# Altium footprint library Miscellaneous SMD.PcbLib: 82 footprints (part 6 of 7) (continued)
## PCI Express x4 [mm] "64 contacts Board Eddge PCI Express x4 Connector"
pads (64):
  rect 0.7x3.2 smd far side paste-0.4: A1(0.65,4)
  rect 0.7x4 smd far side paste-0.4: A2(1.65,3.6) A3(2.65,3.6) A4(3.65,3.6) A5(4.65,3.6) A6(5.65,3.6) A7(6.65,3.6) A8(7.65,3.6) A9(8.65,3.6) A10(9.65,3.6) A11(10.65,3.6) A12(13.65,3.6) A13(14.65,3.6) A14(15.65,3.6) A15(16.65,3.6) A16(17.65,3.6) A17(18.65,3.6) A18(19.65,3.6) A19(20.65,3.6) A20(21.65,3.6) A21(22.65,3.6) A22(23.65,3.601) A23(24.65,3.601) A24(25.65,3.601) A25(26.65,3.601) A26(27.65,3.601) A27(28.65,3.601) A28(29.65,3.601) A29(30.65,3.602) A30(31.65,3.602) A31(32.65,3.602) A32(33.65,3.602)
  rect 0.7x4 smd paste-0.4: B1(0.65,3.6) B2(1.65,3.6) B3(2.65,3.6) B4(3.65,3.6) B5(4.65,3.6) B6(5.65,3.6) B7(6.65,3.6) B8(7.65,3.6) B9(8.65,3.6) B10(9.65,3.6) B11(10.65,3.6) B12(13.65,3.6) B13(14.65,3.6) B14(15.65,3.6) B15(16.65,3.6) B16(17.65,3.6) B18(19.65,3.6) B19(20.65,3.6) B20(21.65,3.6) B21(22.65,3.6) B22(23.65,3.601) B23(24.65,3.601) B24(25.65,3.601) B25(26.65,3.601) B26(27.65,3.601) B27(28.65,3.601) B28(29.65,3.601) B29(30.65,3.602) B30(31.65,3.602) B32(33.65,3.602)
  rect 0.7x3.2 smd paste-0.4: B17(18.65,4) B31(32.65,4.002)
Top Overlay:
  text "B1" at 0.889,6.096 h0.76
  text "B11" at 10.889,6.096 h0.76
  text "B12" at 13.989,6.096 h0.76
  text "B18" at 19.989,6.096 h0.76
  text "B32" at 33.989,6.098 h0.76
Bottom Overlay:
  text "A1" at 0.051,6.02 h0.76
  text "A11" at 10.051,6.02 h0.76
  text "A12" at 13.151,6.02 h0.76
  text "A18" at 19.151,6.02 h0.76
  text "A32" at 33.151,6.022 h0.76
Mechanical 8:
  drawing of 280 lines, arcs and shapes, not listed

## PCI Express x8 [mm] "98 contacts Board Eddge PCI Express x8 Connector"
pads (98):
  rect 0.7x3.2 smd far side paste-0.4: A1(0.65,4)
  rect 0.7x4 smd far side paste-0.4: A2(1.65,3.6) A3(2.65,3.6) A4(3.65,3.6) A5(4.65,3.6) A6(5.65,3.6) A7(6.65,3.6) A8(7.65,3.6) A9(8.65,3.6) A10(9.65,3.6) A11(10.65,3.6) A12(13.65,3.6) A13(14.65,3.6) A14(15.65,3.6) A15(16.65,3.6) A16(17.65,3.6) A17(18.65,3.6) A18(19.65,3.6) A19(20.65,3.6) A20(21.65,3.6) A21(22.65,3.6) A22(23.65,3.601) A23(24.65,3.601) A24(25.65,3.601) A25(26.65,3.601) A26(27.65,3.601) A27(28.65,3.601) A28(29.65,3.601) A29(30.65,3.602) A30(31.65,3.602) A31(32.65,3.602) A32(33.65,3.602) A33(34.65,3.602) A34(35.65,3.602) A35(36.65,3.602) A36(37.65,3.602) A37(38.65,3.602) A38(39.65,3.602) A39(40.65,3.602) A40(41.65,3.602) A41(42.65,3.602) A42(43.65,3.602) A43(44.65,3.602) A44(45.65,3.602) A45(46.65,3.602) A46(47.65,3.602) A47(48.65,3.602) A48(49.65,3.602) A49(50.65,3.602)
  rect 0.7x4 smd paste-0.4: B1(0.65,3.6) B2(1.65,3.6) B3(2.65,3.6) B4(3.65,3.6) B5(4.65,3.6) B6(5.65,3.6) B7(6.65,3.6) B8(7.65,3.6) B9(8.65,3.6) B10(9.65,3.6) B11(10.65,3.6) B12(13.65,3.6) B13(14.65,3.6) B14(15.65,3.6) B15(16.65,3.6) B16(17.65,3.6) B18(19.65,3.6) B19(20.65,3.6) B20(21.65,3.6) B21(22.65,3.6) B22(23.65,3.601) B23(24.65,3.601) B24(25.65,3.601) B25(26.65,3.601) B26(27.65,3.601) B27(28.65,3.601) B28(29.65,3.601) B29(30.65,3.602) B30(31.65,3.602) B32(33.65,3.602) B33(34.65,3.602) B34(35.65,3.602) B35(36.65,3.602) B36(37.65,3.602) B37(38.65,3.602) B38(39.65,3.602) B39(40.65,3.602) B40(41.65,3.602) B41(42.65,3.602) B42(43.65,3.602) B43(44.65,3.602) B44(45.65,3.602) B45(46.65,3.602) B46(47.65,3.602) B47(48.65,3.602) B49(50.65,3.602)
  rect 0.7x3.2 smd paste-0.4: B17(18.65,4) B31(32.65,4.002) B48(49.65,4.002)
Top Overlay:
  text "B1" at 0.889,6.096 h0.76
  text "B11" at 10.889,6.096 h0.76
  text "B12" at 13.989,6.096 h0.76
  text "B18" at 19.989,6.096 h0.76
  text "B32" at 33.989,6.098 h0.76
  text "B49" at 50.989,6.098 h0.76
Bottom Overlay:
  text "A1" at 0.051,6.02 h0.76
  text "A11" at 10.051,6.02 h0.76
  text "A12" at 13.151,6.02 h0.76
  text "A18" at 19.151,6.02 h0.76
  text "A32" at 33.151,6.022 h0.76
  text "A49" at 50.151,6.022 h0.76
Mechanical 8:
  drawing of 308 lines, arcs and shapes, not listed

## PCI Express x16 [mm] "164 contacts Board Eddge PCI Express x16 Connector"
pads (164):
  rect 0.7x3.2 smd far side paste-0.4: A1(0.65,4)
  rect 0.7x4 smd far side paste-0.4: A2(1.65,3.6) A3(2.65,3.6) A4(3.65,3.6) A5(4.65,3.6) A6(5.65,3.6) A7(6.65,3.6) A8(7.65,3.6) A9(8.65,3.6) A10(9.65,3.6) A11(10.65,3.6) A12(13.65,3.6) A13(14.65,3.6) A14(15.65,3.6) A15(16.65,3.6) A16(17.65,3.6) A17(18.65,3.6) A18(19.65,3.6) A19(20.65,3.6) A20(21.65,3.6) A21(22.65,3.6) A22(23.65,3.601) A23(24.65,3.601) A24(25.65,3.601) A25(26.65,3.601) A26(27.65,3.601) A27(28.65,3.601) A28(29.65,3.601) A29(30.65,3.602) A30(31.65,3.602) A31(32.65,3.602) A32(33.65,3.602) A33(34.65,3.602) A34(35.65,3.602) A35(36.65,3.602) A36(37.65,3.602) A37(38.65,3.602) A38(39.65,3.602) A39(40.65,3.602) A40(41.65,3.602) A41(42.65,3.602) A42(43.65,3.602) A43(44.65,3.602) A44(45.65,3.602) A45(46.65,3.602) A46(47.65,3.602) A47(48.65,3.602) A48(49.65,3.602) A49(50.65,3.602) A50(51.65,3.602) A51(52.65,3.602) A52(53.65,3.602) A53(54.65,3.602) A54(55.65,3.602) A55(56.65,3.602) A56(57.65,3.602) A57(58.65,3.602) A58(59.65,3.602) A59(60.65,3.602) A60(61.65,3.602) A61(62.65,3.602) A62(63.65,3.602) A63(64.65,3.602) A64(65.65,3.602) A65(66.65,3.602) A66(67.65,3.602) A67(68.65,3.602) A68(69.65,3.602) A69(70.65,3.602) A70(71.65,3.602) A71(72.65,3.602) A72(73.65,3.602) A73(74.65,3.602) A74(75.65,3.602) A75(76.65,3.602) A76(77.65,3.602) A77(78.65,3.602) A78(79.65,3.602) A79(80.65,3.602) A80(81.65,3.602) A81(82.65,3.602) A82(83.65,3.602)
  rect 0.7x4 smd paste-0.4: B1(0.65,3.6) B2(1.65,3.6) B3(2.65,3.6) B4(3.65,3.6) B5(4.65,3.6) B6(5.65,3.6) B7(6.65,3.6) B8(7.65,3.6) B9(8.65,3.6) B10(9.65,3.6) B11(10.65,3.6) B12(13.65,3.6) B13(14.65,3.6) B14(15.65,3.6) B15(16.65,3.6) B16(17.65,3.6) B18(19.65,3.6) B19(20.65,3.6) B20(21.65,3.6) B21(22.65,3.6) B22(23.65,3.601) B23(24.65,3.601) B24(25.65,3.601) B25(26.65,3.601) B26(27.65,3.601) B27(28.65,3.601) B28(29.65,3.601) B29(30.65,3.602) B30(31.65,3.602) B32(33.65,3.602) B33(34.65,3.602) B34(35.65,3.602) B35(36.65,3.602) B36(37.65,3.602) B37(38.65,3.602) B38(39.65,3.602) B39(40.65,3.602) B40(41.65,3.602) B41(42.65,3.602) B42(43.65,3.602) B43(44.65,3.602) B44(45.65,3.602) B45(46.65,3.602) B46(47.65,3.602) B47(48.65,3.602) B49(50.65,3.602) B50(51.65,3.602) B51(52.65,3.602) B52(53.65,3.602) B53(54.65,3.602) B54(55.65,3.602) B55(56.65,3.602) B56(57.65,3.602) B57(58.65,3.602) B58(59.65,3.602) B59(60.65,3.602) B60(61.65,3.602) B61(62.65,3.602) B62(63.65,3.602) B63(64.65,3.602) B64(65.65,3.602) B65(66.65,3.602) B66(67.65,3.602) B67(68.65,3.602) B68(69.65,3.602) B69(70.65,3.602) B70(71.65,3.602) B71(72.65,3.602) B72(73.65,3.602) B73(74.65,3.602) B74(75.65,3.602) B75(76.65,3.602) B76(77.65,3.602) B77(78.65,3.602) B78(79.65,3.602) B79(80.65,3.602) B80(81.65,3.602) B82(83.65,3.602)
  rect 0.7x3.2 smd paste-0.4: B17(18.65,4) B31(32.65,4.002) B48(49.65,4.002) B81(82.65,4.002)
Top Overlay:
  text "B1" at 0.889,6.096 h0.76
  text "B11" at 10.889,6.096 h0.76
  text "B12" at 13.989,6.096 h0.76
  text "B18" at 19.989,6.096 h0.76
  text "B32" at 33.989,6.098 h0.76
  text "B49" at 50.989,6.098 h0.76
  text "B82" at 83.989,6.098 h0.76
Bottom Overlay:
  text "A1" at 0.051,6.02 h0.76
  text "A11" at 10.051,6.02 h0.76
  text "A12" at 13.151,6.02 h0.76
  text "A18" at 19.151,6.02 h0.76
  text "A32" at 33.151,6.022 h0.76
  text "A49" at 50.151,6.022 h0.76
  text "A82" at 83.151,6.022 h0.76
Mechanical 8:
  drawing of 328 lines, arcs and shapes, not listed

## QSFP+_PCB_EDGE [mm] "38 contacts Board Eddge QSFP+ Connector"
pads (38):
  rect 0.6x2.5 smd far side paste-0.4: 1(15.2,1.8) 4(12.8,1.8) 7(10.4,1.8) 13(5.6,1.8) 16(3.2,1.8) 19(0.8,1.8)
  rect 0.6x1.6 smd far side paste-0.4: 2(14.4,2.25) 3(13.6,2.25) 5(12,2.25) 6(11.2,2.25) 8(9.6,2.25) 9(8.8,2.25) 11(7.2,2.25) 12(6.4,2.25) 14(4.8,2.25) 15(4,2.25) 17(2.4,2.25) 18(1.6,2.25)
  rect 0.6x2 smd far side paste-0.4: 10(8,2.05)
  rect 0.6x2.5 smd paste-0.4: 20(1.2,1.8) 23(3.6,1.8) 26(6,1.8) 32(10.8,1.8) 35(13.2,1.8) 38(15.6,1.8)
  rect 0.6x1.6 smd paste-0.4: 21(2,2.25) 22(2.8,2.25) 24(4.4,2.25) 25(5.2,2.25) 27(6.8,2.25) 28(7.6,2.25) 30(9.2,2.25) 31(10,2.25) 33(11.6,2.25) 34(12.4,2.25) 36(14,2.25) 37(14.8,2.25)
  rect 0.6x2 smd paste-0.4: 29(8.4,2.05)
Top Layer:
  region: 8.1,0.95 8.7,0.95 8.7,0.55 8.1,0.55
  region: 1.7,1.35 2.3,1.35 2.3,0.55 1.7,0.55
  region: 2.5,1.35 3.1,1.35 3.1,0.55 2.5,0.55
  region: 4.9,1.35 5.5,1.35 5.5,0.55 4.9,0.55
  region: 4.1,1.35 4.7,1.35 4.7,0.55 4.1,0.55
  region: 7.3,1.35 7.9,1.35 7.9,0.55 7.3,0.55
  region: 6.5,1.35 7.1,1.35 7.1,0.55 6.5,0.55
  region: 9.7,1.35 10.3,1.35 10.3,0.55 9.7,0.55
  region: 8.9,1.35 9.5,1.35 9.5,0.55 8.9,0.55
  region: 12.1,1.35 12.7,1.35 12.7,0.55 12.1,0.55
  region: 11.3,1.35 11.9,1.35 11.9,0.55 11.3,0.55
  region: 14.5,1.35 15.1,1.35 15.1,0.55 14.5,0.55
  region: 13.7,1.35 14.3,1.35 14.3,0.55 13.7,0.55
Bottom Layer:
  region: 2.7,1.35 2.1,1.35 2.1,0.55 2.7,0.55
  region: 1.9,1.35 1.3,1.35 1.3,0.55 1.9,0.55
  region: 5.1,1.35 4.5,1.35 4.5,0.55 5.1,0.55
  region: 4.3,1.35 3.7,1.35 3.7,0.55 4.3,0.55
  region: 7.5,1.35 6.9,1.35 6.9,0.55 7.5,0.55
  region: 6.7,1.35 6.1,1.35 6.1,0.55 6.7,0.55
  region: 9.9,1.35 9.3,1.35 9.3,0.55 9.9,0.55
  region: 9.1,1.35 8.5,1.35 8.5,0.55 9.1,0.55
  region: 12.3,1.35 11.7,1.35 11.7,0.55 12.3,0.55
  region: 11.5,1.35 10.9,1.35 10.9,0.55 11.5,0.55
  region: 13.9,1.35 13.3,1.35 13.3,0.55 13.9,0.55
  region: 14.7,1.35 14.1,1.35 14.1,0.55 14.7,0.55
  region: 8.3,0.95 7.7,0.95 7.7,0.55 8.3,0.55
Top Overlay:
  text "38" at 15.7,3.7 h0.89
  text "20" at 1.6,3.7 h0.89
Bottom Overlay:
  text "1" at 14.8,3.7 h0.89
  text "19" at 0.7,3.7 h0.89
Top Solder:
  region: 0,3.4 16.4,3.4 16.4,0.5 15.9,0 0.5,0 0,0.5
Bottom Solder:
  region: 0,3.4 16.4,3.4 16.4,0.5 15.9,0 0.5,0 0,0.5
Mechanical 8:
  lines w0.1: -3,0 0,0 0,-3 ; -0.8,7.2 -0.8,6.2 0,5.4 0,0.5 0.5,0 15.9,0 16.4,0.5 16.4,5.4 17.2,6.2 17.2,7.2 ; 0.3,1.8 0.8,1.8 ; 0.7,1.8 1.2,1.8 ; 0.8,1.3 0.8,1.8 ; 1.1,2.25 1.6,2.25 ; 1.2,1.3 1.2,1.8 ; 1.3,1.8 0.8,1.8 ; 1.5,2.25 2,2.25 ; 1.6,2.75 1.6,2.25 ; 1.7,1.8 1.2,1.8 ; 1.9,2.25 2.4,2.25 ; 2,2.75 2,2.25 ; 2.1,2.25 1.6,2.25 ; 2.3,2.25 2.8,2.25 ; 2.4,2.75 2.4,2.25 ; 2.5,2.25 2,2.25 ; 2.7,1.8 3.2,1.8 ; 2.8,2.75 2.8,2.25 ; 2.9,2.25 2.4,2.25 ; 3.1,1.8 3.6,1.8 ; 3.2,1.3 3.2,1.8 ; 3.3,2.25 2.8,2.25 ; 3.5,2.25 4,2.25 ; 3.6,1.3 3.6,1.8 ; 3.7,1.8 3.2,1.8 ; 3.9,2.25 4.4,2.25 ; 4,2.75 4,2.25 ; 4.1,1.8 3.6,1.8 ; 4.3,2.25 4.8,2.25 ; 4.4,2.75 4.4,2.25 ; 4.5,2.25 4,2.25 ; 4.7,2.25 5.2,2.25 ; 4.8,2.75 4.8,2.25 ; 4.9,2.25 4.4,2.25 ; 5.1,1.8 5.6,1.8 ; 5.2,2.75 5.2,2.25 ; 5.3,2.25 4.8,2.25 ; 5.5,1.8 6,1.8 ; 5.6,1.3 5.6,1.8 ; 5.7,2.25 5.2,2.25 ; 5.9,2.25 6.4,2.25 ; 6,1.3 6,1.8 ; 6.1,1.8 5.6,1.8 ; 6.3,2.25 6.8,2.25 ; 6.4,2.75 6.4,2.25 ; 6.5,1.8 6,1.8 ; 6.7,2.25 7.2,2.25 ; 6.8,2.75 6.8,2.25 ; 6.9,2.25 6.4,2.25 ; 7.1,2.25 7.6,2.25 ; 7.2,2.75 7.2,2.25 ; 7.3,2.25 6.8,2.25 ; 7.5,2.05 8,2.05 ; 7.6,2.75 7.6,2.25 ; 7.7,2.25 7.2,2.25 ; 7.9,2.05 8.4,2.05 ; 8,1.55 8,2.05 ; 8.1,2.25 7.6,2.25 ; 8.2,-0.3 8.2,0.3 ; 8.3,2.25 8.8,2.25 ; 8.4,1.55 8.4,2.05 ; 8.5,2.05 8,2.05 ; 8.7,2.25 9.2,2.25 ; 8.8,2.75 8.8,2.25 ; 8.9,2.05 8.4,2.05 ; 9.1,2.25 9.6,2.25 ; 9.2,2.75 9.2,2.25 ; 9.3,2.25 8.8,2.25 ; 9.5,2.25 10,2.25 ; 9.6,2.75 9.6,2.25 ; 9.7,2.25 9.2,2.25 ; 9.9,1.8 10.4,1.8 ; 10,2.75 10,2.25 ; 10.1,2.25 9.6,2.25 ; 10.3,1.8 10.8,1.8 ; 10.4,1.3 10.4,1.8 ; 10.5,2.25 10,2.25 ; 10.7,2.25 11.2,2.25 ; 10.8,1.3 10.8,1.8 ; 10.9,1.8 10.4,1.8 ; 11.1,2.25 11.6,2.25 ; 11.2,2.75 11.2,2.25 ; 11.3,1.8 10.8,1.8 ; 11.5,2.25 12,2.25 ; 11.6,2.75 11.6,2.25 ; 11.7,2.25 11.2,2.25 ; 11.9,2.25 12.4,2.25 ; 12,2.75 12,2.25 ; 12.1,2.25 11.6,2.25 ; 12.3,1.8 12.8,1.8 ; 12.4,2.75 12.4,2.25 ; 12.5,2.25 12,2.25 ; 12.7,1.8 13.2,1.8 ; 12.8,1.3 12.8,1.8 ; 12.9,2.25 12.4,2.25 ; 13.1,2.25 13.6,2.25 ; 13.2,1.3 13.2,1.8 ; 13.3,1.8 12.8,1.8 ; 13.5,2.25 14,2.25 ; 13.6,2.75 13.6,2.25 ; 13.7,1.8 13.2,1.8 ; 13.9,2.25 14.4,2.25 ; 14,2.75 14,2.25 ; 14.1,2.25 13.6,2.25 ; 14.3,2.25 14.8,2.25 ; 14.4,2.75 14.4,2.25 ; 14.5,2.25 14,2.25 ; 14.7,1.8 15.2,1.8 ; 14.8,2.75 14.8,2.25 ; 14.9,2.25 14.4,2.25 ; 15.1,1.8 15.6,1.8 ; 15.2,1.3 15.2,1.8 ; 15.3,2.25 14.8,2.25 ; 15.6,1.3 15.6,1.8 ; 15.7,1.8 15.2,1.8 ; 16.1,1.8 15.6,1.8 ; 16.4,-3 16.4,0 19.4,0

## RDIMM_DDR3 (MO-269) [mm] "RDIMM 240 Contacts (DDR3 Mechanical Keying) Board Edge Connector (JEDEC MO-269)"
pads (240):
  rect 0.8x2.3 smd: 1(-61.5,0) 2(-60.5,0) 3(-59.5,0) 4(-58.5,0) 5(-57.5,0) 6(-56.5,0) 7(-55.5,0) 8(-54.5,0) 9(-53.5,0) 10(-52.5,0) 11(-51.5,0) 12(-50.5,0) 13(-49.5,0) 14(-48.5,0) 15(-47.5,0) 16(-46.5,0) 17(-45.5,0) 18(-44.5,0) 19(-43.5,0) 20(-42.5,0) 21(-41.5,0) 22(-40.5,0) 23(-39.5,0) 24(-38.5,0) 25(-37.5,0) 26(-36.5,0) 27(-35.5,0) 28(-34.5,0) 29(-33.5,0) 30(-32.5,0) 31(-31.5,0) 32(-30.5,0) 33(-29.5,0) 34(-28.5,0) 35(-27.5,0) 36(-26.5,0) 37(-25.5,0) 38(-24.5,0) 39(-23.5,0) 40(-22.5,0) 41(-21.5,0) 42(-20.5,0) 43(-19.5,0) 44(-18.5,0) 45(-17.5,0) 46(-16.5,0) 47(-15.5,0) 48(-14.5,0) 49(-9.5,0) 50(-8.5,0) 51(-7.5,0) 52(-6.5,0) 53(-5.5,0) 54(-4.5,0) 55(-3.5,0) 56(-2.5,0) 57(-1.5,0) 58(-0.5,0) 59(0.5,0) 60(1.5,0) 61(2.5,0) 62(3.5,0) 63(4.5,0) 64(5.5,0) 65(6.5,0) 66(7.5,0) 67(8.5,0) 68(9.5,0) 69(10.5,0) 70(11.5,0) 71(12.5,0) 72(13.5,0) 73(14.5,0) 74(15.5,0) 75(16.5,0) 76(17.5,0) 77(18.5,0) 78(19.5,0) 79(20.5,0) 80(21.5,0) 81(22.5,0) 82(23.5,0) 83(24.5,0) 84(25.5,0) 85(26.5,0) 86(27.5,0) 87(28.5,0) 88(29.5,0) 89(30.5,0) 90(31.5,0) 91(32.5,0) 92(33.5,0) 93(34.5,0) 94(35.5,0) 95(36.5,0) 96(37.5,0) 97(38.5,0) 98(39.5,0) 99(40.5,0) 100(41.5,0) 101(42.5,0) 102(43.5,0) 103(44.5,0) 104(45.5,0) 105(46.5,0) 106(47.5,0) 107(48.5,0) 108(49.5,0) 109(50.5,0) 110(51.5,0) 111(52.5,0) 112(53.5,0) 113(54.5,0) 114(55.5,0) 115(56.5,0) 116(57.5,0) 117(58.5,0) 118(59.5,0) 119(60.5,0) 120(61.5,0)
  rect 0.8x2.3 smd far side: 121(-61.5,0) 122(-60.5,0) 123(-59.5,0) 124(-58.5,0) 125(-57.5,0) 126(-56.5,0) 127(-55.5,0) 128(-54.5,0) 129(-53.5,0) 130(-52.5,0) 131(-51.5,0) 132(-50.5,0) 133(-49.5,0) 134(-48.5,0) 135(-47.5,0) 136(-46.5,0) 137(-45.5,0) 138(-44.5,0) 139(-43.5,0) 140(-42.5,0) 141(-41.5,0) 142(-40.5,0) 143(-39.5,0) 144(-38.5,0) 145(-37.5,0) 146(-36.5,0) 147(-35.5,0) 148(-34.5,0) 149(-33.5,0) 150(-32.5,0) 151(-31.5,0) 152(-30.5,0) 153(-29.5,0) 154(-28.5,0) 155(-27.5,0) 156(-26.5,0) 157(-25.5,0) 158(-24.5,0) 159(-23.5,0) 160(-22.5,0) 161(-21.5,0) 162(-20.5,0) 163(-19.5,0) 164(-18.5,0) 165(-17.5,0) 166(-16.5,0) 167(-15.5,0) 168(-14.5,0) 169(-9.5,0) 170(-8.5,0) 171(-7.5,0) 172(-6.5,0) 173(-5.5,0) 174(-4.5,0) 175(-3.5,0) 176(-2.5,0) 177(-1.5,0) 178(-0.5,0) 179(0.5,0) 180(1.5,0) 181(2.5,0) 182(3.5,0) 183(4.5,0) 184(5.5,0) 185(6.5,0) 186(7.5,0) 187(8.5,0) 188(9.5,0) 189(10.5,0) 190(11.5,0) 191(12.5,0) 192(13.5,0) 193(14.5,0) 194(15.5,0) 195(16.5,0) 196(17.5,0) 197(18.5,0) 198(19.5,0) 199(20.5,0) 200(21.5,0) 201(22.5,0) 202(23.5,0) 203(24.5,0) 204(25.5,0) 205(26.5,0) 206(27.5,0) 207(28.5,0) 208(29.5,0) 209(30.5,0) 210(31.5,0) 211(32.5,0) 212(33.5,0) 213(34.5,0) 214(35.5,0) 215(36.5,0) 216(37.5,0) 217(38.5,0) 218(39.5,0) 219(40.5,0) 220(41.5,0) 221(42.5,0) 222(43.5,0) 223(44.5,0) 224(45.5,0) 225(46.5,0) 226(47.5,0) 227(48.5,0) 228(49.5,0) 229(50.5,0) 230(51.5,0) 231(52.5,0) 232(53.5,0) 233(54.5,0) 234(55.5,0) 235(56.5,0) 236(57.5,0) 237(58.5,0) 238(59.5,0) 239(60.5,0) 240(61.5,0)
Top Overlay:
  text "120" at 63.375,-0.725 h0.76
  text "1" at -62.85,-0.475 h0.76
Bottom Overlay:
  text "240" at 62.675,-0.825 h0.76
  text "121" at -63.6,-0.675 h0.76
Mechanical 8:
  drawing of 804 lines, arcs and shapes, not listed
  text "2.5mm" at -15.325,4.525 h1.2

## SULLINS_SBH21-NBPN-D17-SM-BK [mm] "34 Contacts, Pitch 2mm, Straight Surface Mount Dual Row Male Shrouded Box Header"
height 6.95
pads (34):
  rect 1.02x3.9 smd: 1(-16,-2.35) 2(-16,2.35) 3(-14,-2.35) 4(-14,2.35) 5(-12,-2.35) 6(-12,2.35) 7(-10,-2.35) 8(-10,2.35) 9(-8,-2.35) 10(-8,2.35) 11(-6,-2.35) 12(-6,2.35) 13(-4,-2.35) 14(-4,2.35) 15(-2,-2.35) 16(-2,2.35) 17(0,-2.35) 18(0,2.35) 19(2,-2.35) 20(2,2.35) 21(4,-2.35) 22(4,2.35) 23(6,-2.35) 24(6,2.35) 25(8,-2.35) 26(8,2.35) 27(10,-2.35) 28(10,2.35) 29(12,-2.35) 30(12,2.35) 31(14,-2.35) 32(14,2.35) 33(16,-2.35) 34(16,2.35)
Top Overlay:
  circle w0.25: c-17.375,-3.675 r0.125
  lines w0.2: -17.91,-2.7 -17.41,-1.7 -16.91,-2.7 -21.15,-2.7 -21.15,2.7 -16.91,2.7 ; -17.66,-2.2 -20.65,-2.2 -20.65,2.2 -16.91,2.2 ; -17.16,-2.2 -16.91,-2.2 ; 16.91,-2.7 21.15,-2.7 21.15,2.7 16.91,2.7 ; 16.91,-2.2 20.65,-2.2 20.65,2.2 16.91,2.2
Mechanical 8:
  drawing of 292 lines, arcs and shapes, not listed
Mechanical 14:
  circle w0.25: c-17.375,-3.675 r0.125
  lines w0.1: -16.5,-2.7 -16,-1.7 -15.5,-2.7 ; -21.15,-2.7 21.15,-2.7 21.15,2.7 -21.15,2.7 -21.15,-2.7 ; -20.65,-2.2 20.65,-2.2 20.65,2.2 -20.65,2.2 -20.65,-2.2 ; -2,-2.7 -2,-2.2 2,-2.2 2,-2.7 -2,-2.7
Mechanical 15:
  lines w0.05: -21.4,-4.55 21.4,-4.55 21.4,4.55 -21.4,4.55 -21.4,-4.55
3D body "SULLINS_SBH21-NBPN-D17-SM-BK.stp": height 6.95, standoff 0, extent -21.15,-3.8 21.15,3.8

## TELEGARTNER_J01151A0451 [mm] "SMA 50 ohm Edge Mount Bulkhead Jack Receptacle"
height 7
pads (3):
  rect 1.5x1 smd: 1(0,0)
  rect 8.6x1.1 smd: 2(5.65,-4.2) 2(5.65,4.2)
Top Overlay:
  lines w0.2: 1.1,-0.5 1.35,-0.5 ; 1.1,0.5 1.35,0.5 ; 1.35,-3.2 1.35,3.2 ; 1.35,-2.828 9.95,-2.828 ; 1.35,2.828 9.95,2.828 ; 9.95,-3.2 9.95,3.2 ; 9.95,-3.175 10.45,-3.175 10.45,3.175 9.95,3.175 ; 9.95,-1.534 10.45,-1.534 ; 9.95,1.534 10.45,1.534 ; 10.45,-2.7 11.45,-2.7 ; 10.45,2.7 11.45,2.7 ; 11.692,-1.416 19.85,-1.416 20.292,-1.274 ccw(c17.512,0) 20.292,1.274 19.85,1.416 11.692,1.416 ; 13.15,-4 12.95,-3.312 13.15,-3.253 ; 13.15,-3.415 12.95,-2.868 13.15,-2.36 ; 13.15,-2.31 12.95,-1.656 13.15,-0.886 ; 13.15,-0.817 12.95,0 13.15,0.825 ; 13.15,0.894 12.95,1.656 13.15,2.316 ; 13.15,2.366 12.95,2.868 13.15,3.464 ; 13.15,3.253 12.95,3.312 13.15,4 ; 13.55,-4 13.75,-3.312 13.55,-3.253 ; 13.55,-3.464 13.75,-2.868 13.55,-2.367 ; 13.55,-2.299 13.75,-1.656 13.55,-0.906 ; 13.55,-0.813 13.75,0 13.55,0.813 ; 13.55,0.906 13.75,1.656 13.55,2.306 ; 13.55,2.374 13.75,2.868 13.55,3.464 ; 13.55,3.253 13.75,3.312 13.55,4 ; 14.067,-4 14.067,-3.875 ; 14.067,4 14.067,3.875 ; 15.433,-4 15.433,-3.875 ; 15.433,4 15.433,3.875 ; 21.35,-2.7 20.65,-2.7 ; 21.35,2.7 20.65,2.7 ; 21.45,-2.6 21.45,2.6 ; 11.45,-2.7 11.692,-3.12 ; 11.45,-2.7 11.45,2.7 ; 11.45,2.7 11.692,3.12 ; 11.692,-3.12 19.85,-3.12 ; 11.692,-3.12 11.692,3.12 ; 11.692,3.12 19.85,3.12 ; 14.067,-3.875 cw(c19.461,-2) 14.067,-0.125 ; 14.067,-3.875 15.433,-3.875 ; 14.067,-0.125 14.067,0.125 ; 14.067,-0.125 15.433,-0.125 ; 14.067,0.125 cw(c19.461,2) 14.067,3.875 ; 14.067,0.125 15.433,0.125 ; 14.067,3.875 15.433,3.875 ; 15.433,-3.875 ccw(c10.039,-2) 15.433,-0.125 ; 15.433,-0.125 15.433,0.125 ; 15.433,0.125 ccw(c10.039,2) 15.433,3.875 ; 19.85,-3.12 19.85,3.12 ; 19.85,-3.12 20.292,-3.058 ; 19.85,3.12 20.292,3.058 ; 20.292,-3.058 20.65,-2.7 ; 20.292,-3.058 20.292,3.058 ; 20.292,3.058 20.65,2.7 ; 20.65,-2.7 20.65,2.7 ; 13.15,-4.75 13.55,-4.75 13.55,4.75 13.15,4.75 13.15,-4.75 ; 13.75,-4 13.75,4 15.75,4 15.75,-4 13.75,-4
Keep-Out Layer:
  board cut-out: 1.35,-3.55 1.231,-3.55 1.01,-3.459 0.841,-3.29 0.75,-3.069 0.75,-2.831 0.841,-2.61 1.01,-2.441 1.231,-2.35 1.35,-2.35 1.35,2.35 1.231,2.35 1.01,2.441 0.841,2.61 0.75,2.831 0.75,3.069 0.841,3.29 1.01,3.459 1.231,3.55 1.35,3.55 9.95,3.55 9.95,-3.55
Mechanical 1:
  lines w0.635: 9.95,-3.55 1.35,-3.55 cw(c1.35,-2.95) 1.35,-2.35 1.35,2.35 cw(c1.35,2.95) 1.35,3.55 9.95,3.55
Mechanical 8:
  lines w0.1: -0.5,0 0,0 ; 0,-0.5 0,0 ; 0,0.5 0,0 ; 0.5,0 0,0 ; 5.15,-4.2 5.65,-4.2 ; 5.15,4.2 5.65,4.2 ; 5.65,-4.7 5.65,-4.2 ; 5.65,-3.7 5.65,-4.2 ; 5.65,3.7 5.65,4.2 ; 5.65,4.7 5.65,4.2 ; 6.15,-4.2 5.65,-4.2 ; 6.15,4.2 5.65,4.2 ; 8,1 12.45,1 12.45,0.5 ; 9.95,-0.25 9.95,0.25 ; 9.95,0 12.45,0 ; 12.096,-0.354 12.45,0 ; 12.096,0.354 12.45,0 ; 12.596,-0.354 12.95,0 ; 12.596,0.354 12.95,0 ; 12.95,0.5 12.95,1 15.75,1 ; 12.45,0 12.95,0 ; -0.75,-0.5 0.75,-0.5 0.75,0.5 -0.75,0.5 -0.75,-0.5 ; 1.35,-4.75 1.35,-3.65 9.95,-3.65 9.95,-4.75 1.35,-4.75 ; 1.35,3.65 1.35,4.75 9.95,4.75 9.95,3.65 1.35,3.65
  text "3mm" at 13.05,1.275 h1
  text "2.5mm" at 8,1.25 h1
Mechanical 14:
  lines w0.1: 1.35,-3.5 2.35,-3.5 ; 1.35,-2.828 9.95,-2.828 ; 1.35,-0.5 -0.65,-0.5 -0.65,0.5 1.35,0.5 ; 1.35,2.828 9.95,2.828 ; 1.35,3.5 2.35,3.5 ; 3.35,-3.5 4.35,-3.5 ; 3.35,3.5 4.35,3.5 ; 5.35,-3.5 5.95,-3.5 ; 5.35,3.5 5.95,3.5 ; 6.95,-3.5 7.95,-3.5 ; 6.95,3.5 7.95,3.5 ; 8.95,-3.5 9.95,-3.5 ; 8.95,3.5 9.95,3.5 ; 9.95,-3.175 10.45,-3.175 10.45,3.175 9.95,3.175 ; 9.95,-1.534 10.45,-1.534 ; 9.95,1.534 10.45,1.534 ; 10.45,-2.7 11.45,-2.7 ; 10.45,2.7 11.45,2.7 ; 11.692,-1.416 19.85,-1.416 20.292,-1.274 ccw(c17.512,0) 20.292,1.274 19.85,1.416 11.692,1.416 ; 13.15,-4 12.95,-3.312 13.15,-3.253 ; 13.15,-3.415 12.95,-2.868 13.15,-2.36 ; 13.15,-2.31 12.95,-1.656 13.15,-0.886 ; 13.15,-0.817 12.95,0 13.15,0.825 ; 13.15,0.894 12.95,1.656 13.15,2.316 ; 13.15,2.366 12.95,2.868 13.15,3.464 ; 13.15,3.253 12.95,3.312 13.15,4 ; 13.55,-4 13.75,-3.312 13.55,-3.253 ; 13.55,-3.464 13.75,-2.868 13.55,-2.367 ; 13.55,-2.299 13.75,-1.656 13.55,-0.906 ; 13.55,-0.813 13.75,0 13.55,0.813 ; 13.55,0.906 13.75,1.656 13.55,2.306 ; 13.55,2.374 13.75,2.868 13.55,3.464 ; 13.55,3.253 13.75,3.312 13.55,4 ; 14.067,-4 14.067,-3.875 ; 14.067,4 14.067,3.875 ; 15.433,-4 15.433,-3.875 ; 15.433,4 15.433,3.875 ; 21.35,-2.7 20.65,-2.7 ; 21.35,2.7 20.65,2.7 ; 21.45,-2.6 21.45,2.6 ; 11.45,-2.7 11.692,-3.12 ; 11.45,-2.7 11.45,2.7 ; 11.45,2.7 11.692,3.12 ; 11.692,-3.12 19.85,-3.12 ; 11.692,-3.12 11.692,3.12 ; 11.692,3.12 19.85,3.12 ; 14.067,-3.875 cw(c19.461,-2) 14.067,-0.125 ; 14.067,-3.875 15.433,-3.875 ; 14.067,-0.125 14.067,0.125 ; 14.067,-0.125 15.433,-0.125 ; 14.067,0.125 cw(c19.461,2) 14.067,3.875 ; 14.067,0.125 15.433,0.125 ; 14.067,3.875 15.433,3.875 ; 15.433,-3.875 ccw(c10.039,-2) 15.433,-0.125 ; 15.433,-0.125 15.433,0.125 ; 15.433,0.125 ccw(c10.039,2) 15.433,3.875 ; 19.85,-3.12 19.85,3.12 ; 19.85,-3.12 20.292,-3.058 ; 19.85,3.12 20.292,3.058 ; 20.292,-3.058 20.65,-2.7 ; 20.292,-3.058 20.292,3.058 ; 20.292,3.058 20.65,2.7 ; 20.65,-2.7 20.65,2.7 ; 1.35,-4.5 9.95,-4.5 9.95,4.5 1.35,4.5 1.35,-4.5 ; 13.15,-4.75 13.55,-4.75 13.55,4.75 13.15,4.75 13.15,-4.75 ; 13.75,-4 13.75,4 15.75,4 15.75,-4 13.75,-4
Drill Drawing:
  lines w0.1: 1.348,2.468 0.926,3.374 ; 1.832,2.952 0.926,3.374 ; 2.29,-2.104 1.35,-1.762 ; 2.29,-1.42 1.35,-1.762 ; 5.14,2.083 2.217,2.083 0.926,3.374 ; 7.794,-2.61 8.136,-3.55 ; 7.794,2.61 8.136,3.55 ; 8.478,-2.61 8.136,-3.55 ; 8.478,2.61 8.136,3.55 ; 9.01,-2.104 9.95,-1.762 ; 9.01,-1.42 9.95,-1.762 ; 9.95,-4.55 9.95,-3.55 1.35,-3.55 cw(c1.35,-2.95) 1.35,-2.35 1.35,2.35 cw(c1.35,2.95) 1.35,3.55 9.95,3.55 9.95,4.55 ; 9.95,-2.762 9.95,-0.762 ; 1.35,-1.762 9.95,-1.762 ; 8.136,-3.55 8.136,3.55
  text "7.1" at 7.889,-0.244 h1
  text "8.6" at 4.762,-1.609 h1
  text "r0.6" at 2.536,2.233 h1
3D body "TELEGARTNER_J01151A0451_Part1.stp": height 4, standoff -3.6, extent -0.65,-4.498 21.45,4.498
3D body "TELEGARTNER_J01151A0451_Part2.stp": height 5.25, standoff -4.25, extent 12.95,-4.75 15.75,4.75

## WURTH_653 104 131 822 [mm] "4 Contacts, Pitch 1.25mm, SMT Male Horizontal Shrouded Header"
height 3.55
pads (6):
  rect 0.81x1.6 smd: 1(-1.875,0) 2(-0.625,0) 3(0.625,0) 4(1.875,0)
  rect 2.1x3 smd: P1(-4.425,-2.9) P2(4.425,-2.9)
Top Overlay:
  circle w0.3: c-2.95,0.5 r0.15
  lines w0.2: -3.375,-4.75 -3.375,-4.955 -1.425,-4.955 -1.425,-3.555 -1.725,-3.555 ; -3.375,-1.05 -3.375,-0.755 -2.63,-0.755 ; -3.025,-3.355 3.025,-3.355 ; -3.025,-1.455 -2.875,-1.455 -2.875,-0.755 ; -2.775,-4.955 -2.775,-3.355 ; -2.125,-1.15 -2.125,-1.455 -1.625,-1.455 -1.625,-1.15 ; -2.025,-3.355 -2.025,-4.085 -1.725,-4.085 -1.725,-3.355 ; -0.875,-1.15 -0.875,-1.455 -0.375,-1.455 -0.375,-1.15 ; -0.775,-3.555 -1.025,-3.555 -1.025,-4.955 1.025,-4.955 1.025,-3.555 0.775,-3.555 ; -0.775,-3.355 -0.775,-4.085 -0.475,-4.085 -0.475,-3.355 ; 0.375,-1.15 0.375,-1.455 0.875,-1.455 0.875,-1.15 ; 0.475,-3.355 0.475,-4.085 0.775,-4.085 0.775,-3.355 ; 1.625,-1.15 1.625,-1.455 2.125,-1.455 2.125,-1.15 ; 1.725,-3.555 1.425,-3.555 1.425,-4.955 3.375,-4.955 3.375,-4.75 ; 1.725,-3.355 1.725,-4.085 2.025,-4.085 2.025,-3.355 ; 2.63,-0.755 3.375,-0.755 3.375,-1.05 ; 2.775,-4.955 2.775,-3.355 ; 2.875,-0.755 2.875,-1.455 3.025,-1.455
  text "1" at -1.375,-2.2 h1
  text "4" at 2.375,-2.6 h1
Mechanical 8:
  lines w0.05: -0.5,0 0,0 ; 0,-0.5 0,0 ; 0,0.5 0,0 ; 0.5,0 0,0 ; -5.475,-4.4 -4.425,-2.9 -3.375,-4.4 ; -5.475,-4.4 -5.475,-1.4 -3.375,-1.4 -3.375,-4.4 ; -5.475,-4.4 -3.375,-4.4 ; -2.28,-0.8 -1.875,0 -1.47,-0.8 ; -2.28,-0.8 -2.28,0.8 -1.47,0.8 -1.47,-0.8 ; -2.28,-0.8 -1.47,-0.8 ; -1.03,-0.8 -0.625,0 -0.22,-0.8 ; -1.03,-0.8 -1.03,0.8 -0.22,0.8 -0.22,-0.8 ; -1.03,-0.8 -0.22,-0.8 ; 0.22,-0.8 0.625,0 1.03,-0.8 ; 0.22,-0.8 0.22,0.8 1.03,0.8 1.03,-0.8 ; 0.22,-0.8 1.03,-0.8 ; 1.47,-0.8 1.875,0 2.28,-0.8 ; 1.47,-0.8 1.47,0.8 2.28,0.8 2.28,-0.8 ; 1.47,-0.8 2.28,-0.8 ; 3.375,-4.4 4.425,-2.9 5.475,-4.4 ; 3.375,-4.4 3.375,-1.4 5.475,-1.4 5.475,-4.4 ; 3.375,-4.4 5.475,-4.4
Mechanical 14:
  circle w0.3: c-2.95,0.5 r0.15
  lines w0.1: -4.625,-4.575 -4.625,-1.775 ; -3.825,-4.575 -3.825,-1.775 ; -3.375,-4.575 -4.875,-4.575 -4.875,-1.775 -3.375,-1.775 ; -3.375,-3.355 3.375,-3.355 ; -3.375,-1.455 -2.875,-1.455 -2.875,-0.755 ; -2.775,-4.955 -2.775,-3.355 ; -2.125,-0.755 -2.125,-1.455 -1.625,-1.455 -1.625,-0.755 ; -2.025,-3.355 -2.025,-4.085 -1.725,-4.085 -1.725,-3.355 ; -2.025,-0.755 -2.025,0.455 -1.725,0.455 -1.725,-0.755 ; -2.025,-0.545 -1.725,-0.545 ; -2.025,0.255 -1.725,0.255 ; -1.725,-3.555 -1.425,-3.555 -1.425,-4.955 -3.375,-4.955 -3.375,-0.755 3.375,-0.755 3.375,-4.955 1.425,-4.955 1.425,-3.555 1.725,-3.555 ; -0.875,-0.755 -0.875,-1.455 -0.375,-1.455 -0.375,-0.755 ; -0.775,-3.555 -1.025,-3.555 -1.025,-4.955 1.025,-4.955 1.025,-3.555 0.775,-3.555 ; -0.775,-3.355 -0.775,-4.085 -0.475,-4.085 -0.475,-3.355 ; -0.775,-0.755 -0.775,0.455 -0.475,0.455 -0.475,-0.755 ; -0.775,-0.545 -0.475,-0.545 ; -0.775,0.255 -0.475,0.255 ; 0.375,-0.755 0.375,-1.455 0.875,-1.455 0.875,-0.755 ; 0.475,-3.355 0.475,-4.085 0.775,-4.085 0.775,-3.355 ; 0.475,-0.755 0.475,0.455 0.775,0.455 0.775,-0.755 ; 0.475,-0.545 0.775,-0.545 ; 0.475,0.255 0.775,0.255 ; 1.625,-0.755 1.625,-1.455 2.125,-1.455 2.125,-0.755 ; 1.725,-3.355 1.725,-4.085 2.025,-4.085 2.025,-3.355 ; 1.725,-0.755 1.725,0.455 2.025,0.455 2.025,-0.755 ; 1.725,-0.545 2.025,-0.545 ; 1.725,0.255 2.025,0.255 ; 2.775,-4.955 2.775,-3.355 ; 2.875,-0.755 2.875,-1.455 3.375,-1.455 ; 3.375,-4.575 4.875,-4.575 4.875,-1.775 3.375,-1.775 ; 3.825,-4.575 3.825,-1.775 ; 4.625,-4.575 4.625,-1.775
Mechanical 15:
  lines w0.05: -5.725,-5.205 -5.725,1.05 5.725,1.05 5.725,-5.205 -5.725,-5.205
3D body "WURTH_653 104 131 822.stp": height 3.4, standoff 0, extent -4.875,-4.955 4.875,0.455